# Altium footprint library Connectors.PcbLib: 76 footprints (part 5 of 5)
Each footprint in its own frame and in the unit in brackets; x right, y up, seen from the top. Pads: shape width x height; smd on the part's side, far side on the other; paste and mask are expansions set on the pad; w line width, h text height; cw(c..) or ccw(c..) is an arc to the next point about the centre after c.
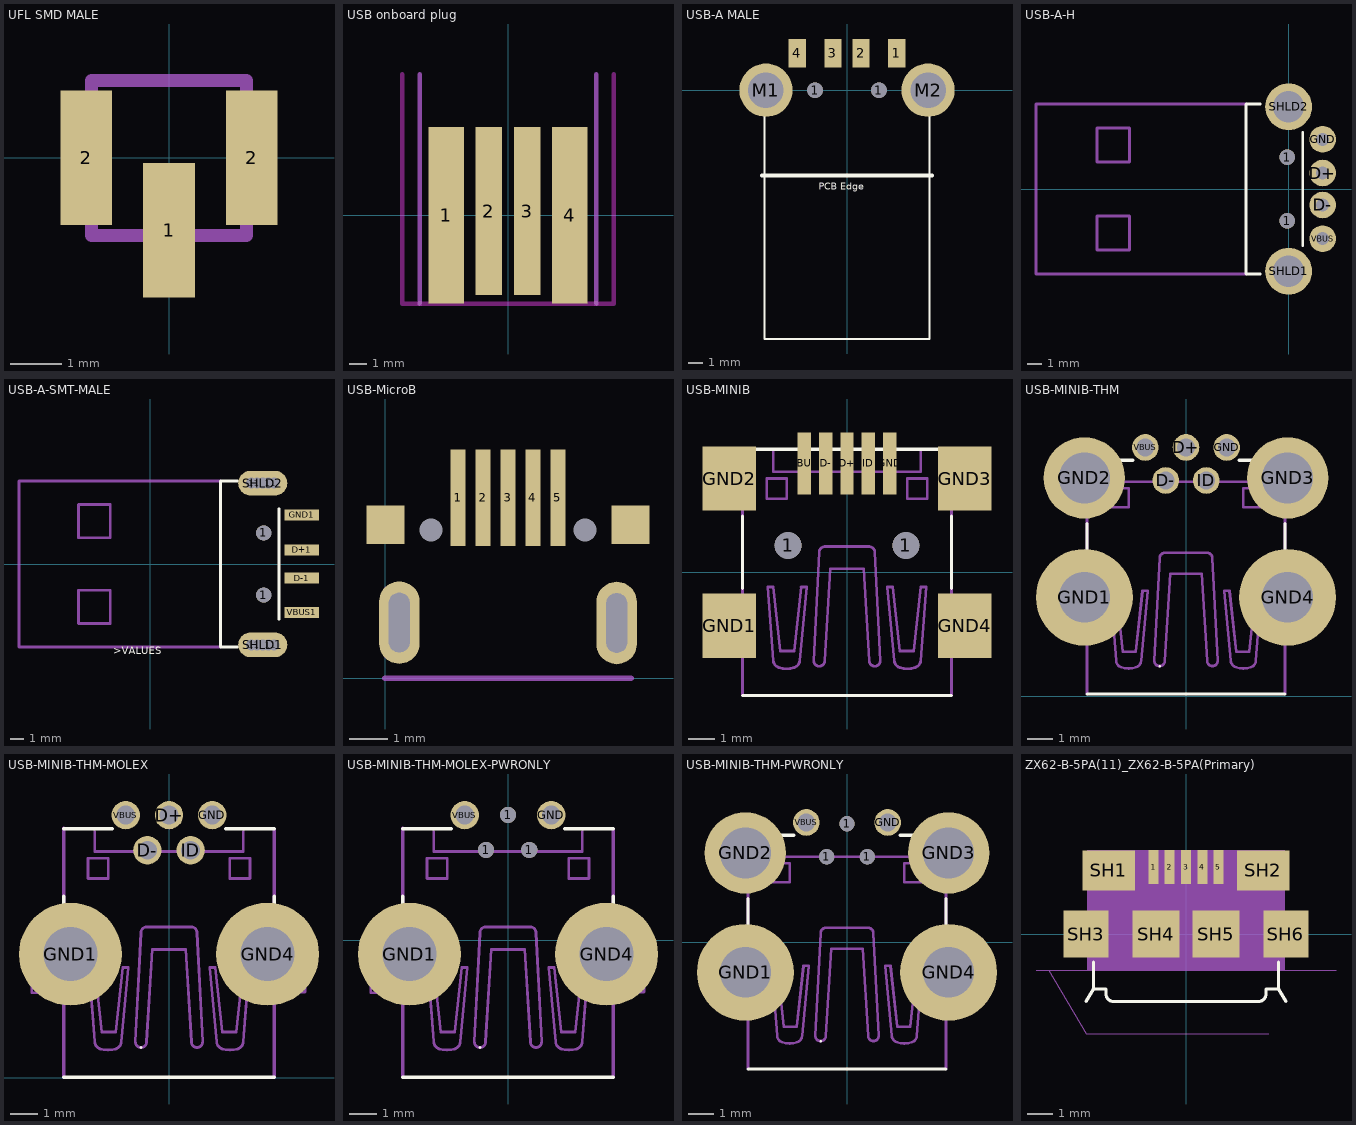
[diagram p4: the footprints below, top view; thin cyan lines are the x and y axes]

## UFL SMD MALE [mm]
pads (3):
  rect 1x2.6 smd: 1(0,-1.4) 2(-1.6,0) 2(1.6,0)
Mechanical 1:
  lines w0.254: -1.5,-1.5 -1.5,1.5 1.5,1.5 1.5,-1.5 -1.5,-1.5

## USB onboard plug [mm]
pads (4):
  rect 2x10 smd: 1(-3.5,0) 4(3.5,0)
  rect 1.5x9.5 smd: 2(-1.1,0.25) 3(1.1,0.25)
Keep-Out Layer:
  lines w0.254: -6,8 -6,-5 6,-5 6,8
Mechanical 1:
  lines w0.254: -5,-5 -5,8 ; 5,-5 5,8

## USB-A MALE [mm]
pads (8):
  round 1.1 hole 1.1: 1(-2.25,0) 1(2.25,0)
  rect 1.2x2 smd: 1(3.5,2.6) 2(1,2.6) 3(-1,2.6) 4(-3.5,2.6)
  round 3.75 hole 2.5: M1(-5.7,0) M2(5.7,0)
Top Overlay:
  lines w0.127: -5.8,0 -5.8,-17.5 5.8,-17.5 5.8,0
  lines w0.254: -6,-6 0,-6 6,-6
  text "PCB Edge" at -2,-7 h0.5
3D body "usb a male.stp": height 4.5, standoff -1.3, extent -6.256,-17.526 6.35,2.774

## USB-A-H [mil]
pads (8):
  round 43.31 hole 43.31: 1(-3.94,-88.58) 1(-3.94,88.58)
  round 74 hole 36: D+(94.49,44.37) D-(94.49,-44.37) GND(94.49,137.8) VBUS(94.49,-137.8)
  round 129.91 hole 86.61: SHLD1(0,-228.35) SHLD2(0,228.35)
Top Overlay:
  lines w8: -78.74,-236.22 -118.11,-236.22 -118.11,236.22 -78.74,236.22 ; 39.37,-157.48 39.37,157.48
Mechanical 16:
  lines w8: -118.11,-236.22 -700.79,-236.22 -700.79,236.22 -118.11,236.22 ; -531.5,-169.29 -440.94,-169.29 -440.94,-74.8 -531.5,-74.8 -531.5,-169.29 ; -531.5,74.8 -440.94,74.8 -440.94,169.29 -531.5,169.29 -531.5,74.8
  text "PCB Edge" at -153.54,-173.23 h77.5
3D body "usb a male.stp": height 177.17, standoff -51.16, extent -704.61,-240 94.61,256.29

## USB-A-SMT-MALE [mil]
pads (16):
  round 31.5 hole 31.5: 1(288.58,-230.32) 1(288.58,230.32) 1(304.33,-230.32) 1(304.33,230.32) 1(335.83,-230.32) 1(335.83,230.32) 1(351.57,-230.32) 1(351.57,230.32)
  round 43.31 hole 43.31: 1(322.83,-88.58) 1(322.83,88.58)
  rect 98.43x31.5 smd: D+1(431.1,40.43) D-1(431.1,-40.43) GND1(431.1,139.8) VBUS1(431.1,-137.8)
  oval 140x70 hole 31.5: SHLD1(320.08,-230.32) SHLD2(320.08,230.32)
Top Overlay:
  lines w8: 248.03,-236.22 200,-236.22 200,236.22 248.03,236.22 ; 366.14,-157.48 366.14,157.48
  text ">VALUES" at -106.3,-257.09 h20.4
Mechanical 16:
  lines w8: 200,-236.22 -374.02,-236.22 -374.02,236.22 200,236.22 ; -204.72,-169.29 -204.72,-74.8 -114.17,-74.8 -114.17,-169.29 -204.72,-169.29 ; -204.72,74.8 -204.72,169.29 -114.17,169.29 -114.17,74.8 -204.72,74.8
  text "PCB Edge" at 173.23,-173.23 h77.5
3D body "usb a male.stp": height 177.17, standoff -51.16, extent -375,-238.15 424.22,258.15

## USB-MicroB [mm] "G19"
pads (11):
  rect 0.4x2.5 smd: 1(1.9,4.7) 2(2.55,4.7) 3(3.2,4.7) 4(3.85,4.7) 5(4.5,4.7)
  rect 1x1 smd: ""(0.01,4) ""(6.39,4)
  rrect100% 1.05x2.15 hole 0.55 slot 1.55 at 90 deg: ""(0.37,1.45) ""(6.03,1.44)
  round 0 hole 0.6: ""(1.2,3.86) ""(5.2,3.86)
Mechanical 1:
  lines w0.152: 3.2,0 0,0 ; 6.1,0 0,0 ; 6.4,0 0,0

## USB-MINIB [mm]
pads (11):
  round 1 hole 1: 1(-2.2,1) 1(2.2,1)
  rect 0.5x2.308 smd: D+(0,4.064) D-(-0.8,4.064) GND(1.6,4.064) ID(0.8,4.064) VBUS(-1.6,4.064)
  rect 2x2.4 smd: GND1(-4.4,-2) GND2(-4.4,3.5) GND3(4.4,3.5) GND4(4.4,-2)
Top Overlay:
  lines w0.127: -3.9,-4.6 3.9,-4.6 ; -3.9,-0.6 -3.9,2.1 ; -3.9,4.6 3.9,4.6 ; -3.2,4.6 -2.1,4.6 ; 2.1,4.6 3.2,4.6 ; 3.9,-0.6 3.9,2.1
Mechanical 16:
  lines w0.102: -5.08,-2.67 -5.08,-2.32 ccw(c-5.08,-2.02) -5.08,-1.72 -5.08,-1.32 ; -5.08,2.87 -5.08,3.22 ccw(c-5.08,3.52) -5.08,3.82 -5.08,4.22 ; -5.06,-2.679 -3.91,-2.679 ; -5.06,-1.301 -3.91,-1.301 ; -5.06,2.861 -3.91,2.861 ; -5.06,4.239 -3.91,4.239 ; -2.75,4.5 -2.75,3.75 2.75,3.75 2.75,4.5 ; -1.038,-3.506 cw(c-1.038,-3.299) -1.246,-3.298 -1.038,0.751 cw(c-0.819,0.739) -0.831,0.958 0.83,0.958 cw(c0.818,0.739) 1.038,0.751 1.246,-3.298 cw(c1.038,-3.299) 1.038,-3.506 cw(c1.038,-3.298) 0.83,-3.298 0.623,0.128 -0.623,0.128 -0.831,-3.298 cw(c-1.038,-3.299) -1.038,-3.506 ; 3.88,-2.659 5.03,-2.659 ; 3.88,-1.281 5.03,-1.281 ; 3.88,2.881 5.03,2.881 ; 3.88,4.259 5.03,4.259 ; 5.05,-2.64 5.05,-2.24 cw(c5.05,-1.94) 5.05,-1.64 5.05,-1.29 ; 5.05,2.9 5.05,3.3 cw(c5.05,3.6) 5.05,3.9 5.05,4.25 ; -3,2.75 -2.25,2.75 -2.25,3.5 -3,3.5 -3,2.75 ; -2.959,-0.547 -2.751,-3.298 ccw(c-2.457,-3.276) -2.544,-3.558 ccw(c-2.258,-2.627) -1.973,-3.558 ccw(c-2.059,-3.276) -1.765,-3.298 -1.505,-0.547 -1.713,-0.547 -1.973,-2.935 -2.492,-2.935 -2.751,-0.547 -2.959,-0.547 ; 1.505,-0.547 1.765,-3.298 ccw(c2.059,-3.276) 1.973,-3.558 ccw(c2.258,-2.627) 2.544,-3.558 ccw(c2.457,-3.276) 2.751,-3.298 2.959,-0.547 2.751,-0.547 2.492,-2.935 1.973,-2.935 1.713,-0.547 1.505,-0.547 ; 2.25,2.75 2.25,3.5 3,3.5 3,2.75 2.25,2.75
  lines w0.127: -3.9,-4.6 -3.9,-2.7 ; -3.9,-1.29 -3.9,2.81 ; -3.9,4.25 -3.9,4.6 ; 3.9,-4.6 3.9,-2.7 ; 3.9,-1.24 3.9,2.86 ; 3.9,4.3 3.9,4.6

## USB-MINIB-THM [mm]
pads (9):
  round 1.05 hole 0.7: D+(0,9.8) D-(-0.8,8.5) GND(1.6,9.8) ID(0.8,8.5) VBUS(-1.6,9.8)
  round 3.81 hole 2: GND1(-4,3.9) GND4(4,3.9)
  round 3.2 hole 2: GND2(-4,8.6) GND3(4,8.6)
Top Overlay:
  lines w0.102: -1.038,1.194 -1.038,1.194
  lines w0.127: -3.9,0.1 3.9,0.1 ; -3.9,4.1 -3.9,6.8 ; -3.2,9.3 -2.1,9.3 ; 2.1,9.3 3.2,9.3 ; 3.9,4.7 3.9,6.8
Mechanical 16:
  lines w0.102: -5.08,3.23 -5.08,3.58 ccw(c-5.08,3.88) -5.08,4.18 -5.08,4.58 ; -5.08,7.57 -5.08,7.92 ccw(c-5.08,8.22) -5.08,8.52 -5.08,8.92 ; -5.06,3.221 -3.91,3.221 ; -5.06,4.599 -3.91,4.599 ; -5.06,7.561 -3.91,7.561 ; -5.06,8.939 -3.91,8.939 ; -2.75,9.2 -2.75,8.45 2.75,8.45 2.75,9.2 ; -1.038,1.194 cw(c-1.038,1.401) -1.246,1.402 -1.038,5.451 cw(c-0.819,5.439) -0.831,5.658 0.83,5.658 cw(c0.818,5.439) 1.038,5.451 1.246,1.402 cw(c1.038,1.401) 1.038,1.194 cw(c1.038,1.402) 0.83,1.402 0.623,4.828 -0.623,4.828 -0.831,1.402 cw(c-1.038,1.401) -1.038,1.194 ; 3.88,3.241 5.03,3.241 ; 3.88,4.619 5.03,4.619 ; 3.88,7.581 5.03,7.581 ; 3.88,8.959 5.03,8.959 ; 5.05,3.26 5.05,3.66 cw(c5.05,3.96) 5.05,4.26 5.05,4.61 ; 5.05,7.6 5.05,8 cw(c5.05,8.3) 5.05,8.6 5.05,8.95 ; -3,7.45 -2.25,7.45 -2.25,8.2 -3,8.2 -3,7.45 ; -2.959,4.153 -2.751,1.402 ccw(c-2.457,1.424) -2.544,1.142 ccw(c-2.258,2.073) -1.973,1.142 ccw(c-2.059,1.424) -1.765,1.402 -1.505,4.153 -1.713,4.153 -1.973,1.765 -2.492,1.765 -2.751,4.153 -2.959,4.153 ; 1.505,4.153 1.765,1.402 ccw(c2.059,1.424) 1.973,1.142 ccw(c2.258,2.073) 2.544,1.142 ccw(c2.457,1.424) 2.751,1.402 2.959,4.153 2.751,4.153 2.492,1.765 1.973,1.765 1.713,4.153 1.505,4.153 ; 2.25,7.45 2.25,8.2 3,8.2 3,7.45 2.25,7.45
  lines w0.127: -3.9,0.1 -3.9,3.2 ; -3.9,4.61 -3.9,7.51 ; -3.9,8.95 -3.9,9.3 ; 3.9,0.1 3.9,3.2 ; 3.9,4.66 3.9,7.56 ; 3.9,9 3.9,9.3

## USB-MINIB-THM-MOLEX [mil]
pads (7):
  round 41.34 hole 27.56: D+(0,382.68) D-(-31.5,331.5) GND(62.99,382.68) ID(31.5,331.5) VBUS(-62.99,382.68)
  round 150 hole 78.74: GND1(-143.7,179.92) GND4(143.7,179.92)
Top Overlay:
  lines w4: -40.88,43.85 -40.87,43.85
  lines w5: -153.54,0.79 153.54,0.79 ; -153.54,158.27 -153.54,264.57 ; -153.54,362.99 -82.68,362.99 ; 82.68,362.99 153.54,362.99 ; 153.54,181.89 153.54,264.57
Mechanical 16:
  lines w4: -200,124.02 -200,137.8 ccw(c-200,149.61) -200,161.42 -200,177.17 ; -199.21,123.65 -153.94,123.65 ; -199.21,177.92 -153.94,177.92 ; -108.27,359.06 -108.27,329.53 108.27,329.53 108.27,359.06 ; -40.88,43.85 cw(c-40.88,52.02) -49.05,52.03 -40.88,211.45 cw(c-32.23,210.97) -32.7,219.62 32.69,219.62 cw(c32.22,210.97) 40.87,211.45 49.04,52.03 cw(c40.87,52.02) 40.87,43.85 cw(c40.87,52.03) 32.69,52.03 24.52,186.92 -24.54,186.92 -32.7,52.03 cw(c-40.88,52.02) -40.87,43.85 ; 152.76,124.44 198.03,124.44 ; 152.76,178.72 198.03,178.72 ; 198.82,125.2 198.82,140.94 cw(c198.82,152.75) 198.82,164.57 198.82,178.35 ; -118.11,290.16 -118.11,319.69 -88.58,319.69 -88.58,290.16 -118.11,290.16 ; -116.5,160.35 -108.32,160.35 -98.11,66.33 -77.67,66.33 -67.45,160.35 -59.27,160.35 -69.49,52.03 cw(c-81.07,52.91) -77.67,41.81 cw(c-88.91,78.46) -100.15,41.81 cw(c-96.75,52.91) -108.32,52.03 -116.5,160.35 ; 59.26,160.35 67.44,160.35 77.66,66.33 98.1,66.33 108.32,160.35 116.49,160.35 108.32,52.03 cw(c96.74,52.91) 100.14,41.81 cw(c88.9,78.46) 77.66,41.81 cw(c81.06,52.91) 69.48,52.03 59.26,160.35 ; 88.58,290.16 118.11,290.16 118.11,319.69 88.58,319.69 88.58,290.16
  lines w5: -153.54,0.79 -153.54,122.83 ; -153.54,178.35 -153.54,363.39 ; 153.54,0.79 153.54,122.83 ; 153.54,180.32 153.54,361.42

## USB-MINIB-THM-MOLEX-PWRONLY [mil]
pads (7):
  round 23.62 hole 23.62: 1(-32,132) 1(0,183) 1(31,132)
  round 41.34 hole 27.56: GND(62.99,182.68) VBUS(-62.99,182.68)
  round 150 hole 78.74: GND1(-143.7,-20.08) GND4(143.7,-20.08)
Top Overlay:
  lines w4: -40.88,-156.15 -40.87,-156.15
  lines w5: -153.54,-199.21 153.54,-199.21 ; -153.54,-41.73 -153.54,64.57 ; -153.54,162.99 -82.68,162.99 ; 82.68,162.99 153.54,162.99 ; 153.54,-18.11 153.54,64.57
Mechanical 16:
  lines w4: -200,-75.98 -200,-62.2 ccw(c-200,-50.39) -200,-38.58 -200,-22.83 ; -199.21,-76.35 -153.94,-76.35 ; -199.21,-22.08 -153.94,-22.08 ; -108.27,159.06 -108.27,129.53 108.27,129.53 108.27,159.06 ; -40.88,-156.15 cw(c-40.88,-147.97) -49.05,-147.97 -40.88,11.45 cw(c-32.23,10.97) -32.7,19.62 32.69,19.62 cw(c32.22,10.97) 40.87,11.45 49.04,-147.97 cw(c40.87,-147.97) 40.87,-156.15 cw(c40.87,-147.97) 32.69,-147.97 24.52,-13.08 -24.54,-13.08 -32.7,-147.97 cw(c-40.88,-147.97) -40.87,-156.15 ; 152.76,-75.56 198.03,-75.56 ; 152.76,-21.28 198.03,-21.28 ; 198.82,-74.8 198.82,-59.06 cw(c198.82,-47.24) 198.82,-35.43 198.82,-21.65 ; -118.11,90.16 -88.58,90.16 -88.58,119.69 -118.11,119.69 -118.11,90.16 ; -116.5,-39.65 -108.32,-147.97 ccw(c-96.75,-147.09) -100.15,-158.19 ccw(c-88.91,-121.54) -77.67,-158.19 ccw(c-81.07,-147.09) -69.49,-147.97 -59.27,-39.65 -67.45,-39.65 -77.67,-133.67 -98.11,-133.67 -108.32,-39.65 -116.5,-39.65 ; 59.26,-39.65 69.48,-147.97 ccw(c81.06,-147.09) 77.66,-158.19 ccw(c88.9,-121.54) 100.14,-158.19 ccw(c96.74,-147.09) 108.32,-147.97 116.49,-39.65 108.32,-39.65 98.1,-133.67 77.66,-133.67 67.44,-39.65 59.26,-39.65 ; 88.58,90.16 88.58,119.69 118.11,119.69 118.11,90.16 88.58,90.16
  lines w5: -153.54,-199.21 -153.54,-77.17 ; -153.54,-21.65 -153.54,163.39 ; 153.54,-199.21 153.54,-77.17 ; 153.54,-19.69 153.54,161.42

## USB-MINIB-THM-PWRONLY [mm]
pads (9):
  round 0.6 hole 0.6: 1(-0.8,3.37) 1(0,4.67) 1(0.8,3.37)
  round 1.05 hole 0.7: GND(1.6,4.72) VBUS(-1.6,4.72)
  round 3.81 hole 2: GND1(-4,-1.18) GND4(4,-1.18)
  round 3.2 hole 2: GND2(-4,3.52) GND3(4,3.52)
Top Overlay:
  lines w0.102: -1.038,-3.886 -1.038,-3.886
  lines w0.127: -3.9,-4.98 3.9,-4.98 ; -3.9,-0.98 -3.9,1.72 ; -3.2,4.22 -2.1,4.22 ; 2.1,4.22 3.2,4.22 ; 3.9,-0.38 3.9,1.72
Mechanical 16:
  lines w0.102: -5.08,-1.85 -5.08,-1.5 ccw(c-5.08,-1.2) -5.08,-0.9 -5.08,-0.5 ; -5.08,2.49 -5.08,2.84 ccw(c-5.08,3.14) -5.08,3.44 -5.08,3.84 ; -5.06,-1.859 -3.91,-1.859 ; -5.06,-0.481 -3.91,-0.481 ; -5.06,2.481 -3.91,2.481 ; -5.06,3.859 -3.91,3.859 ; -2.75,4.12 -2.75,3.37 2.75,3.37 2.75,4.12 ; -1.038,-3.886 cw(c-1.038,-3.679) -1.246,-3.678 -1.038,0.371 cw(c-0.819,0.359) -0.831,0.578 0.83,0.578 cw(c0.818,0.359) 1.038,0.371 1.246,-3.678 cw(c1.038,-3.679) 1.038,-3.886 cw(c1.038,-3.678) 0.83,-3.678 0.623,-0.252 -0.623,-0.252 -0.831,-3.678 cw(c-1.038,-3.679) -1.038,-3.886 ; 3.88,-1.839 5.03,-1.839 ; 3.88,-0.461 5.03,-0.461 ; 3.88,2.501 5.03,2.501 ; 3.88,3.879 5.03,3.879 ; 5.05,-1.82 5.05,-1.42 cw(c5.05,-1.12) 5.05,-0.82 5.05,-0.47 ; 5.05,2.52 5.05,2.92 cw(c5.05,3.22) 5.05,3.52 5.05,3.87 ; -3,2.37 -2.25,2.37 -2.25,3.12 -3,3.12 -3,2.37 ; -2.959,-0.927 -2.751,-3.678 ccw(c-2.457,-3.656) -2.544,-3.938 ccw(c-2.258,-3.007) -1.973,-3.938 ccw(c-2.059,-3.656) -1.765,-3.678 -1.505,-0.927 -1.713,-0.927 -1.973,-3.315 -2.492,-3.315 -2.751,-0.927 -2.959,-0.927 ; 1.505,-0.927 1.765,-3.678 ccw(c2.059,-3.656) 1.973,-3.938 ccw(c2.258,-3.007) 2.544,-3.938 ccw(c2.457,-3.656) 2.751,-3.678 2.959,-0.927 2.751,-0.927 2.492,-3.315 1.973,-3.315 1.713,-0.927 1.505,-0.927 ; 2.25,2.37 2.25,3.12 3,3.12 3,2.37 2.25,2.37
  lines w0.127: -3.9,-4.98 -3.9,-1.88 ; -3.9,-0.47 -3.9,2.43 ; -3.9,3.87 -3.9,4.22 ; 3.9,-4.98 3.9,-1.88 ; 3.9,-0.42 3.9,2.48 ; 3.9,3.92 3.9,4.22

## ZX62-B-5PA(11)_ZX62-B-5PA(Primary) [mm]
pads (11):
  rect 0.4x1.35 smd: 1(-1.3,2.675) 2(-0.65,2.675) 3(0,2.675) 4(0.65,2.675) 5(1.3,2.675)
  rect 2.1x1.6 smd: SH1(-3.1,2.55) SH2(3.1,2.55)
  rect 1.8x1.9 smd: SH3(-4,0) SH6(4,0)
  rect 1.9x1.9 smd: SH4(-1.2,0) SH5(1.2,0)
Top Overlay:
  lines w0.127: -4,-2.7 -3.7,-2.2 ; -3.7,-1.13 -3.7,-2.2 ; 3.7,-1.13 3.7,-2.2 ; 4,-2.7 3.7,-2.2 ; -3.7,-2.2 -3.2,-2.2 -3.2,-2.4 ccw(c-2.9,-2.4) -2.9,-2.7 2.9,-2.7 ccw(c2.9,-2.4) 3.2,-2.4 3.2,-2.2 3.7,-2.2
Mechanical 1:
  region: -3.955,3.35 3.95,3.35 3.95,-1.452 -3.955,-1.452
  lines w0: -6,-1.45 -5.5,-1.45 ; 3.3,-4 -4,-4 -5.5,-1.45 ; 6,-1.45 -5.5,-1.45
  lines w0.127: -3.7,-1.1 -3.7,1.1 ; -3.7,1.6 -3.7,2.9 3.7,2.9 3.7,1.6 ; 3.7,-1.1 3.7,1.1
  text "PCB Edge" at -4.01,-4.26 h1.88